# Altium schematic symbol library FPGA_Xilinx_Virtex7.SchLib: 34 symbols (part 5 of 26)
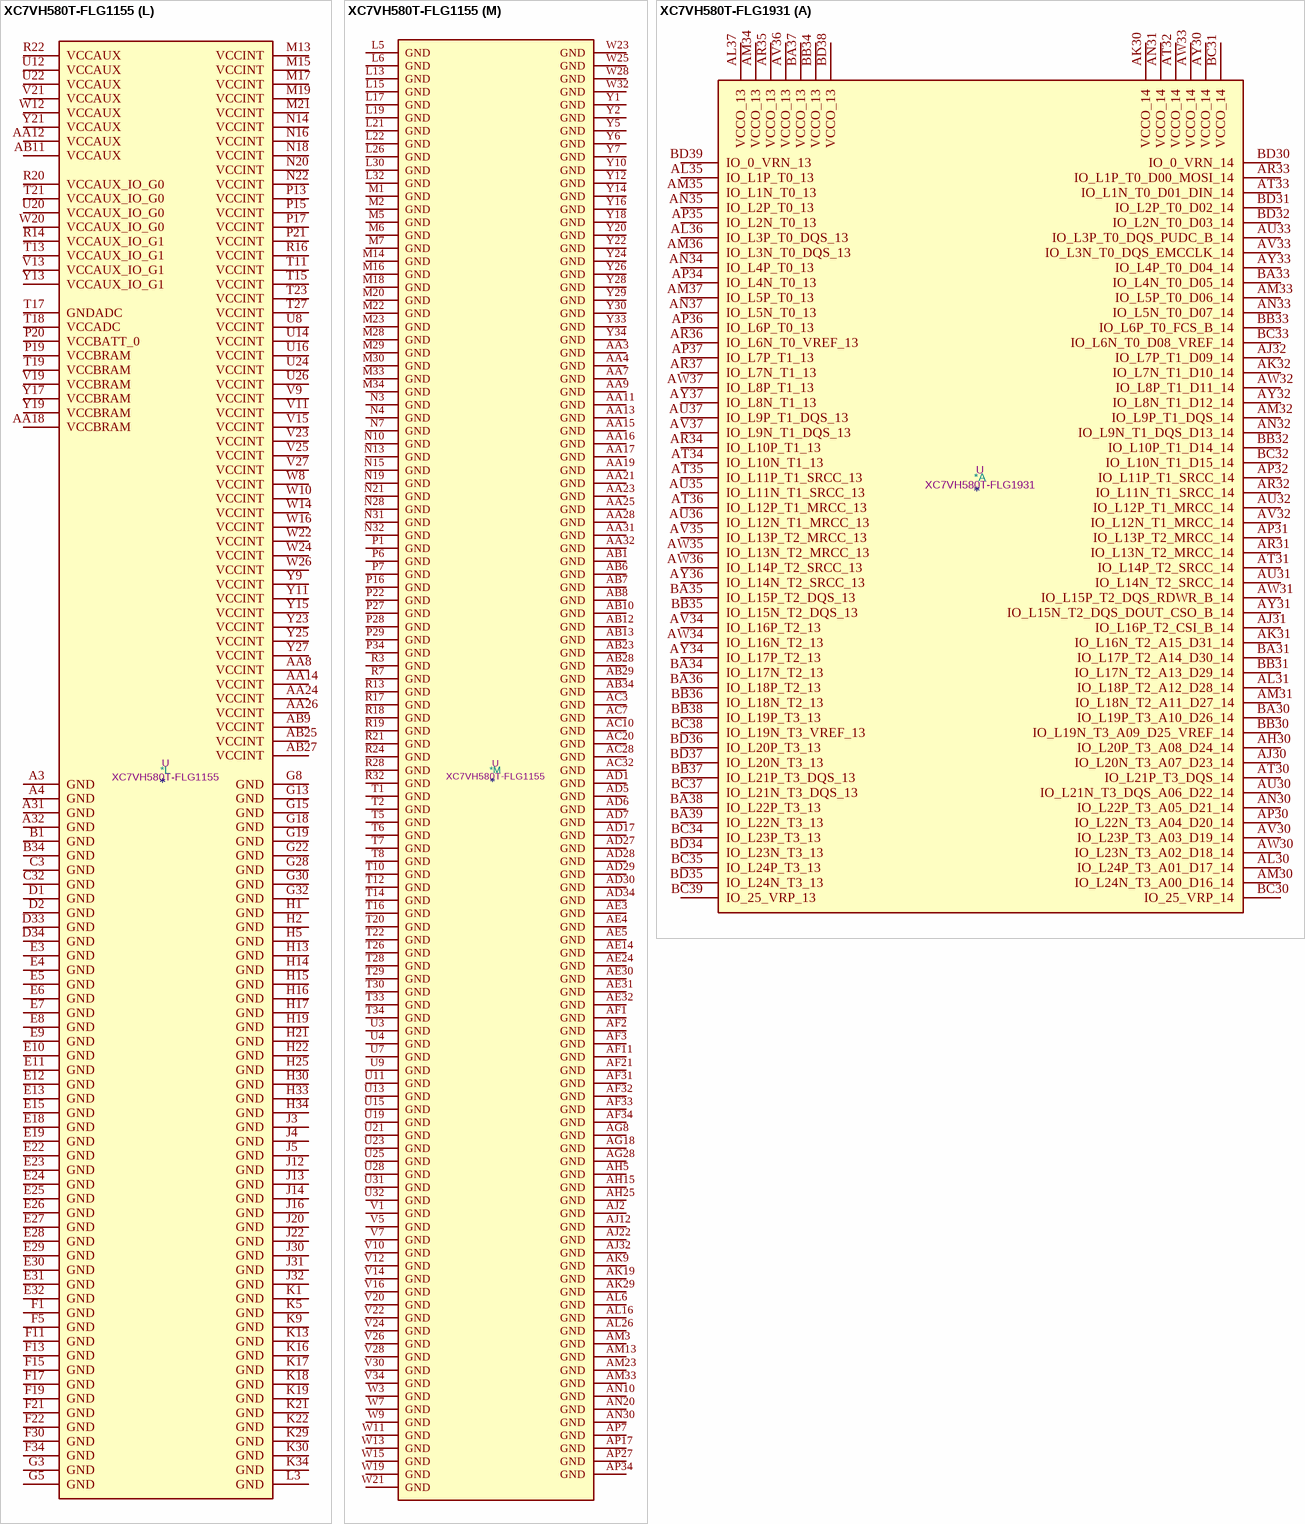
[diagram p176: symbols XC7VH580T-FLG1155 to XC7VH580T-FLG1931]

## XC7VH580T-FLG1155
designator *  value XC7VH580T-FLG1155  Reference: U
ki_keywords: FPGA; ki_description: Virtex 7 HT 580 XC7VH580T-FLG1155
part A pins: AB24 IO_L5P_T0_13, AC23 IO_L1P_T0_13, AC24 IO_L5N_T0_13, AC25 VCCO_13, AC26 IO_L4P_T0_13, AC27 IO_L4N_T0_13, AD23 IO_L1N_T0_13, AD24 IO_L2P_T0_13, AD25 IO_L2N_T0_13, AD26 IO_L3P_T0_DQS_13, AE23 IO_L16P_T2_13, AE25 IO_L17P_T2_13, AE26 IO_L3N_T0_DQS_13, AE27 IO_L6P_T0_13, AE28 IO_L1P_T0_D00_MOSI_14, AE29 VCCO_14, AF23 IO_L16N_T2_13, AF24 IO_L15P_T2_DQS_13, AF25 IO_L17N_T2_13, AF26 VCCO_13, AF27 IO_L6N_T0_VREF_13, AF28 IO_L1N_T0_D01_DIN_14, AF29 IO_L3P_T0_DQS_PUDC_B_14, AF30 IO_L7P_T1_D09_14, AG23 VCCO_13, AG24 IO_L15N_T2_DQS_13, AG25 IO_L14P_T2_SRCC_13, AG26 IO_L14N_T2_SRCC_13, AG27 IO_L7P_T1_13, AG29 IO_L3N_T0_DQS_EMCCLK_14, AG30 IO_L7N_T1_D10_14, AG31 IO_L8P_T1_D11_14, AG32 IO_L8N_T1_D12_14, AG33 VCCO_14, AG34 IO_L10P_T1_D14_14, AH23 IO_L18P_T2_13, AH24 IO_L13P_T2_MRCC_13, AH26 IO_L9P_T1_DQS_13, AH27 IO_L7N_T1_13, AH28 IO_L4P_T0_D04_14, AH29 IO_L4N_T0_D05_14, AH30 VCCO_14, AH31 IO_L11P_T1_SRCC_14, AH32 IO_L9P_T1_DQS_14, AH33 IO_L9N_T1_DQS_D13_14, AH34 IO_L10N_T1_D15_14, AJ23 IO_L18N_T2_13, AJ24 IO_L13N_T2_MRCC_13, AJ25 IO_L11P_T1_SRCC_13, AJ26 IO_L9N_T1_DQS_13, AJ27 VCCO_13, AJ28 IO_L5P_T0_D06_14, AJ29 IO_L2P_T0_D02_14, AJ30 IO_L2N_T0_D03_14, AJ31 IO_L11N_T1_SRCC_14, AJ33 IO_L17P_T2_A14_D30_14, AJ34 IO_L17N_T2_A13_D29_14, AK23 IO_L20P_T3_13, AK24 VCCO_13, AK25 IO_L11N_T1_SRCC_13, AK26 IO_L8P_T1_13, AK27 IO_L8N_T1_13, AK28 IO_L5N_T0_D07_14, AK30 IO_L12P_T1_MRCC_14, AK31 IO_L12N_T1_MRCC_14, AK32 IO_L13P_T2_MRCC_14, AK33 IO_L14P_T2_SRCC_14, AK34 VCCO_14, AL22 IO_L24P_T3_13, AL23 IO_L20N_T3_13, AL24 IO_L12P_T1_MRCC_13, AL25 IO_L12N_T1_MRCC_13, AL27 IO_0_VRN_13, AL28 IO_L6P_T0_FCS_B_14, AL29 IO_L6N_T0_D08_VREF_14, AL30 IO_L21P_T3_DQS_14, AL31 VCCO_14, AL32 IO_L13N_T2_MRCC_14, AL33 IO_L14N_T2_SRCC_14, AL34 IO_L16P_T2_CSI_B_14, AM22 IO_L24N_T3_13, AM24 IO_L23P_T3_13, AM25 IO_L10P_T1_13, AM26 IO_L10N_T1_13, AM27 IO_L20P_T3_A08_D24_14, AM28 VCCO_14, AM29 IO_L19P_T3_A10_D26_14, AM30 IO_L21N_T3_DQS_A06_D22_14, AM31 IO_L23P_T3_A03_D19_14, AM32 IO_L15P_T2_DQS_RDWR_B_14, AM34 IO_L16N_T2_A15_D31_14, AN22 IO_25_VRP_13, AN23 IO_L21P_T3_DQS_13, AN24 IO_L23N_T3_13, AN25 VCCO_13, AN26 IO_L22P_T3_13, AN27 IO_L20N_T3_A07_D23_14, AN28 IO_L24P_T3_A01_D17_14, AN29 IO_L19N_T3_A09_D25_VREF_14, AN31 IO_L23N_T3_A02_D18_14, AN32 IO_L15N_T2_DQS_DOUT_CSO_B_14, AN33 IO_L18P_T2_A12_D28_14, AN34 IO_0_VRN_14, AP22 VCCO_13, AP23 IO_L21N_T3_DQS_13, AP24 IO_L19P_T3_13, AP25 IO_L19N_T3_VREF_13, AP26 IO_L22N_T3_13, AP28 IO_L24N_T3_A00_D16_14, AP29 IO_L22P_T3_A05_D21_14, AP30 IO_L22N_T3_A04_D20_14, AP31 IO_25_VRP_14, AP32 VCCO_14, AP33 IO_L18N_T2_A11_D27_14
part B pins: AA20 IO_L5P_T0_AD9P_15, AA22 VCCO_15, AB18 VCCO_15, AB19 IO_0_VRN_15, AB20 IO_L5N_T0_AD9N_15, AB21 IO_L20P_T3_A20_15, AB22 IO_L22P_T3_A17_15, AC18 IO_L1P_T0_AD0P_15, AC19 IO_L3P_T0_DQS_AD1P_15, AC21 IO_L20N_T3_A19_15, AC22 IO_L22N_T3_A16_15, AD18 IO_L1N_T0_AD0N_15, AD19 IO_L3N_T0_DQS_AD1N_15, AD20 IO_L16P_T2_A28_15, AD21 IO_L21P_T3_DQS_15, AD22 VCCO_15, AE18 IO_L4P_T0_15, AE19 VCCO_15, AE20 IO_L16N_T2_A27_15, AE21 IO_L21N_T3_DQS_A18_15, AE22 IO_L24P_T3_RS1_15, AF18 IO_L4N_T0_15, AF19 IO_L6P_T0_15, AF20 IO_L18P_T2_A24_15, AF22 IO_L24N_T3_RS0_15, AG19 IO_L6N_T0_VREF_15, AG20 IO_L18N_T2_A23_15, AG21 IO_25_VRP_15, AG22 IO_L23P_T3_FOE_B_15, AH18 IO_L2P_T0_AD8P_15, AH19 IO_L2N_T0_AD8N_15, AH20 VCCO_15, AH21 IO_L17P_T2_A26_15, AH22 IO_L23N_T3_FWE_B_15, AJ18 IO_L15P_T2_DQS_15, AJ19 IO_L15N_T2_DQS_ADV_B_15, AJ20 IO_L13P_T2_MRCC_15, AJ21 IO_L17N_T2_A25_15, AK18 IO_L7P_T1_AD2P_15, AK20 IO_L13N_T2_MRCC_15, AK21 IO_L19P_T3_A22_15, AK22 IO_L19N_T3_A21_VREF_15, AL18 IO_L7N_T1_AD2N_15, AL19 IO_L14P_T2_SRCC_15, AL20 IO_L14N_T2_SRCC_15, AL21 VCCO_15, AM18 VCCO_15, AM19 IO_L12P_T1_MRCC_15, AM20 IO_L12N_T1_MRCC_15, AM21 IO_L11P_T1_SRCC_15, AN18 IO_L10P_T1_AD11P_15, AN19 IO_L9P_T1_DQS_AD3P_15, AN21 IO_L11N_T1_SRCC_15, AP18 IO_L10N_T1_AD11N_15, AP19 IO_L9N_T1_DQS_AD3N_15, AP20 IO_L8P_T1_AD10P_15, AP21 IO_L8N_T1_AD10N_15, F23 IO_25_VRP_16, F24 IO_L8P_T1_16, F25 IO_L8N_T1_16, F26 VCCO_16, F27 IO_L19P_T3_16, F28 IO_L19N_T3_VREF_16, F29 VCCO_16, G23 VCCO_16, G24 IO_L9N_T1_DQS_16, G25 IO_L10P_T1_16, G26 IO_L10N_T1_16, G27 IO_L22N_T3_16, G29 IO_L23N_T3_16, H23 IO_L7P_T1_16, H24 IO_L9P_T1_DQS_16, H26 IO_L12N_T1_MRCC_16, H27 IO_L22P_T3_16, H28 IO_L21N_T3_DQS_16, H29 IO_L23P_T3_16, J23 IO_L6N_T0_VREF_16, J24 IO_L7N_T1_16, J25 IO_L11N_T1_SRCC_16, J26 IO_L12P_T1_MRCC_16, J27 VCCO_16, J28 IO_L21P_T3_DQS_16, J29 IO_L20N_T3_16, K23 IO_L6P_T0_16, K24 VCCO_16, K25 IO_L11P_T1_SRCC_16, K26 IO_L13P_T2_MRCC_16, K27 IO_L13N_T2_MRCC_16, K28 IO_L20P_T3_16, L23 IO_L2P_T0_16, L24 IO_L2N_T0_16, L25 IO_L14N_T2_SRCC_16, L27 IO_L17N_T2_16, L28 IO_L24P_T3_16, L29 IO_L24N_T3_16, M24 IO_0_VRN_16, M25 IO_L14P_T2_SRCC_16, M26 IO_L17P_T2_16, M27 IO_L18N_T2_16, N23 IO_L4N_T0_16, N24 IO_L3N_T0_DQS_16, N25 VCCO_16, N26 IO_L15N_T2_DQS_16, N27 IO_L18P_T2_16, P23 IO_L4P_T0_16, P24 IO_L3P_T0_DQS_16, P25 IO_L5N_T0_16, P26 IO_L15P_T2_DQS_16, R23 IO_L1P_T0_16, R25 IO_L5P_T0_16, R26 IO_L16P_T2_16, R27 IO_L16N_T2_16, T24 IO_L1N_T0_16, T25 VCCO_16
part C pins: AC8 IO_L4P_T0_33, AC9 IO_L2P_T0_33, AC11 IO_L1N_T0_33, AC12 IO_L1P_T0_33, AD8 IO_L4N_T0_33, AD9 IO_L2N_T0_33, AD10 IO_L3N_T0_DQS_33, AD11 IO_L3P_T0_DQS_33, AD12 VCCO_33, AE6 IO_L1P_T0_34, AE7 IO_L5P_T0_34, AE8 IO_L6P_T0_33, AE9 VCCO_33, AE10 IO_L5N_T0_33, AE11 IO_L5P_T0_33, AE12 IO_L16P_T2_33, AF4 IO_L7P_T1_34, AF5 IO_L1N_T0_34, AF6 VCCO_34, AF7 IO_L5N_T0_34, AF8 IO_L6N_T0_VREF_33, AF9 IO_L17P_T2_33, AF10 IO_L15P_T2_DQS_33, AF12 IO_L16N_T2_33, AG1 IO_L10P_T1_34, AG2 IO_L9P_T1_DQS_34, AG3 VCCO_34, AG4 IO_L7N_T1_34, AG5 IO_L2N_T0_34, AG6 IO_L2P_T0_34, AG7 IO_L4P_T0_34, AG9 IO_L17N_T2_33, AG10 IO_L15N_T2_DQS_33, AG11 IO_L13P_T2_MRCC_33, AG12 IO_L18P_T2_33, AH1 IO_L10N_T1_34, AH2 IO_L9N_T1_DQS_34, AH3 IO_L8N_T1_34, AH4 IO_L8P_T1_34, AH6 IO_L3P_T0_DQS_34, AH7 IO_L4N_T0_34, AH8 IO_L7N_T1_33, AH9 IO_L7P_T1_33, AH10 VCCO_33, AH11 IO_L13N_T2_MRCC_33, AH12 IO_L18N_T2_33, AJ1 IO_L17P_T2_34, AJ3 IO_L11N_T1_SRCC_34, AJ4 IO_L11P_T1_SRCC_34, AJ5 IO_L12P_T1_MRCC_34, AJ6 IO_L3N_T0_DQS_34, AJ7 VCCO_34, AJ8 IO_L9N_T1_DQS_33, AJ9 IO_L9P_T1_DQS_33, AJ10 IO_L14N_T2_SRCC_33, AJ11 IO_L14P_T2_SRCC_33, AK1 IO_L17N_T2_34, AK2 IO_L14P_T2_SRCC_34, AK3 IO_L13P_T2_MRCC_34, AK4 VCCO_34, AK5 IO_L12N_T1_MRCC_34, AK6 IO_L6N_T0_VREF_34, AK7 IO_L6P_T0_34, AK8 IO_L8P_T1_33, AK10 IO_L11N_T1_SRCC_33, AK11 IO_L11P_T1_SRCC_33, AK12 IO_L20P_T3_33, AL1 VCCO_34, AL2 IO_L14N_T2_SRCC_34, AL3 IO_L13N_T2_MRCC_34, AL4 IO_L23N_T3_34, AL5 IO_L23P_T3_34, AL7 IO_L20P_T3_34, AL8 IO_L8N_T1_33, AL9 IO_L12N_T1_MRCC_33, AL10 IO_L12P_T1_MRCC_33, AL11 VCCO_33, AL12 IO_L20N_T3_33, AM1 IO_L16P_T2_34, AM2 IO_L15P_T2_DQS_34, AM4 IO_L21P_T3_DQS_34, AM5 IO_L19N_T3_VREF_34, AM6 IO_L19P_T3_34, AM7 IO_L20N_T3_34, AM8 VCCO_33, AM9 IO_L10N_T1_33, AM10 IO_L10P_T1_33, AM11 IO_L24N_T3_33, AM12 IO_L24P_T3_33, AN1 IO_L16N_T2_34, AN2 IO_L15N_T2_DQS_34, AN3 IO_L18P_T2_34, AN4 IO_L21N_T3_DQS_34, AN5 VCCO_34, AN6 IO_L24N_T3_34, AN7 IO_L24P_T3_34, AN8 IO_L22N_T3_33, AN9 IO_L22P_T3_33, AN11 IO_L21N_T3_DQS_33, AN12 IO_L21P_T3_DQS_33, AN13 IO_L23P_T3_33, AP1 IO_0_VRN_34, AP2 VCCO_34, AP3 IO_L18N_T2_34, AP4 IO_25_VRP_34, AP5 IO_L22N_T3_34, AP6 IO_L22P_T3_34, AP8 IO_0_VRN_33, AP9 IO_L19N_T3_VREF_33, AP10 IO_L19P_T3_33, AP11 IO_25_VRP_33, AP12 VCCO_33, AP13 IO_L23N_T3_33
part D pins: AB14 IO_L20P_T3_35, AB15 IO_0_VRN_35, AB16 IO_L4P_T0_35, AB17 IO_L1P_T0_AD4P_35, AC13 IO_L22P_T3_35, AC14 IO_L20N_T3_35, AC15 VCCO_35, AC16 IO_L4N_T0_35, AC17 IO_L1N_T0_AD4N_35, AD13 IO_L22N_T3_35, AD14 IO_25_VRP_35, AD15 IO_L16P_T2_35, AD16 IO_L3P_T0_DQS_AD5P_35, AE13 IO_L24P_T3_35, AE15 IO_L16N_T2_35, AE16 IO_L3N_T0_DQS_AD5N_35, AE17 IO_L5P_T0_AD13P_35, AF13 IO_L24N_T3_35, AF14 IO_L21P_T3_DQS_35, AF15 IO_L18P_T2_35, AF16 VCCO_35, AF17 IO_L5N_T0_AD13N_35, AG13 VCCO_35, AG14 IO_L21N_T3_DQS_35, AG15 IO_L18N_T2_35, AG16 IO_L6P_T0_35, AG17 IO_L2P_T0_AD12P_35, AH13 IO_L23P_T3_35, AH14 IO_L19P_T3_35, AH16 IO_L6N_T0_VREF_35, AH17 IO_L2N_T0_AD12N_35, AJ13 IO_L23N_T3_35, AJ14 IO_L19N_T3_VREF_35, AJ15 IO_L13P_T2_MRCC_35, AJ16 IO_L15P_T2_DQS_35, AJ17 VCCO_35, AK13 IO_L17P_T2_35, AK14 VCCO_35, AK15 IO_L13N_T2_MRCC_35, AK16 IO_L15N_T2_DQS_35, AK17 IO_L7P_T1_AD6P_35, AL13 IO_L17N_T2_35, AL14 IO_L14N_T2_SRCC_35, AL15 IO_L14P_T2_SRCC_35, AL17 IO_L7N_T1_AD6N_35, AM14 IO_L11P_T1_SRCC_35, AM15 IO_L12N_T1_MRCC_35, AM16 IO_L12P_T1_MRCC_35, AM17 IO_L9P_T1_DQS_AD7P_35, AN14 IO_L11N_T1_SRCC_35, AN15 VCCO_35, AN16 IO_L8P_T1_AD14P_35, AN17 IO_L9N_T1_DQS_AD7N_35, AP14 IO_L10N_T1_AD15N_35, AP15 IO_L10P_T1_AD15P_35, AP16 IO_L8N_T1_AD14N_35, F6 VCCO_36, F7 IO_L22N_T3_36, F8 IO_L22P_T3_36, F9 IO_L10N_T1_36, F10 IO_25_VRP_36, F12 IO_L8N_T1_36, G6 IO_L23N_T3_36, G7 IO_L21N_T3_DQS_36, G9 IO_L10P_T1_36, G10 IO_L9N_T1_DQS_36, G11 IO_L9P_T1_DQS_36, G12 IO_L8P_T1_36, H6 IO_L23P_T3_36, H7 IO_L21P_T3_DQS_36, H8 IO_L19N_T3_VREF_36, H9 IO_L12N_T1_MRCC_36, H10 VCCO_36, H11 IO_L7N_T1_36, H12 IO_L7P_T1_36, J6 IO_L20N_T3_36, J7 VCCO_36, J8 IO_L19P_T3_36, J9 IO_L12P_T1_MRCC_36, J10 IO_L11N_T1_SRCC_36, J11 IO_L6N_T0_VREF_36, K6 IO_L20P_T3_36, K7 IO_L24N_T3_36, K8 IO_L17N_T2_36, K10 IO_L11P_T1_SRCC_36, K11 IO_L6P_T0_36, K12 IO_L2N_T0_36, L7 IO_L24P_T3_36, L8 IO_L17P_T2_36, L9 IO_L13N_T2_MRCC_36, L10 IO_L14N_T2_SRCC_36, L11 VCCO_36, L12 IO_L2P_T0_36, M8 VCCO_36, M9 IO_L13P_T2_MRCC_36, M10 IO_L14P_T2_SRCC_36, M11 IO_L4N_T0_36, M12 IO_L4P_T0_36, N8 IO_L18N_T2_36, N9 IO_L15N_T2_DQS_36, N11 IO_L3N_T0_DQS_36, N12 IO_0_VRN_36, P8 IO_L18P_T2_36, P9 IO_L15P_T2_DQS_36, P10 IO_L5N_T0_36, P11 IO_L3P_T0_DQS_36, P12 VCCO_36, R8 IO_L16N_T2_36, R9 VCCO_36, R10 IO_L5P_T0_36, R11 IO_L1N_T0_36, R12 IO_L1P_T0_36, T9 IO_L16P_T2_36
part E pins: AA1 MGTHTXN1_113, AA2 MGTHTXP1_113, AA5 MGTREFCLK1N_113, AA6 MGTREFCLK1P_113, AB3 MGTHRXN2_113, AB4 MGTHRXP2_113, AC1 MGTHTXN0_113, AC2 MGTHTXP0_113, AC5 MGTREFCLK0N_113, AC6 MGTREFCLK0P_113, AD3 MGTHRXN1_113, AD4 MGTHRXP1_113, J1 MGTHTXN3_114, J2 MGTHTXP3_114, K3 MGTHRXN2_114, K4 MGTHRXP2_114, L1 MGTHTXN2_114, L2 MGTHTXP2_114, M3 MGTHRXN3_114, M4 MGTHRXP3_114, N1 MGTHTXN1_114, N2 MGTHTXP1_114, P3 MGTHRXN1_114, P4 MGTHRXP1_114, R1 MGTHTXN0_114, R2 MGTHTXP0_114, T3 MGTHRXN0_114, T4 MGTHRXP0_114, U1 MGTHTXN3_113, U2 MGTHTXP3_113, U5 MGTREFCLK1N_114, U6 MGTREFCLK1P_114, V3 MGTHRXN3_113, V4 MGTHRXP3_113, W1 MGTHTXN2_113, W2 MGTHTXP2_113, W5 MGTREFCLK0N_114, W6 MGTREFCLK0P_114, Y3 MGTHRXN0_113, Y4 MGTHRXP0_113
part F pins: A1 MGTHTXN3_115, A2 MGTHTXP3_115, AA29 MGTREFCLK1P_213, AA30 MGTREFCLK1N_213, AA33 MGTHTXP1_213, AA34 MGTHTXN1_213, AB31 MGTHRXP2_213, AB32 MGTHRXN2_213, AC29 MGTREFCLK0P_213, AC30 MGTREFCLK0N_213, AC33 MGTHTXP0_213, AC34 MGTHTXN0_213, AD31 MGTHRXP1_213, AD32 MGTHRXN1_213, B3 MGTHRXN3_115, B4 MGTHRXP3_115, C1 MGTHTXN2_115, C2 MGTHTXP2_115, D3 MGTHRXN2_115, D4 MGTHRXP2_115, E1 MGTHTXN1_115, E2 MGTHTXP1_115, F3 MGTHRXN1_115, F4 MGTHRXP1_115, G1 MGTHTXN0_115, G2 MGTHTXP0_115, H3 MGTHRXN0_115, H4 MGTHRXP0_115, N5 MGTREFCLK0N_115, N6 MGTREFCLK0P_115, R5 MGTREFCLK1N_115, R6 MGTREFCLK1P_115, U33 MGTHTXP3_213, U34 MGTHTXN3_213, V31 MGTHRXP3_213, V32 MGTHRXN3_213, W33 MGTHTXP2_213, W34 MGTHTXN2_213, Y31 MGTHRXP0_213, Y32 MGTHRXN0_213
part G pins: A33 MGTHTXP3_215, A34 MGTHTXN3_215, B31 MGTHRXP3_215, B32 MGTHRXN3_215, C33 MGTHTXP2_215, C34 MGTHTXN2_215, D31 MGTHRXP2_215, D32 MGTHRXN2_215, E33 MGTHTXP1_215, E34 MGTHTXN1_215, F31 MGTHRXP1_215, F32 MGTHRXN1_215, G33 MGTHTXP0_215, G34 MGTHTXN0_215, H31 MGTHRXP0_215, H32 MGTHRXN0_215, J33 MGTHTXP3_214, J34 MGTHTXN3_214, K31 MGTHRXP2_214, K32 MGTHRXN2_214, L33 MGTHTXP2_214, L34 MGTHTXN2_214, M31 MGTHRXP3_214, M32 MGTHRXN3_214, N29 MGTREFCLK0P_215, N30 MGTREFCLK0N_215, N33 MGTHTXP1_214, N34 MGTHTXN1_214, P31 MGTHRXP1_214, P32 MGTHRXN1_214, R29 MGTREFCLK1P_215, R30 MGTREFCLK1N_215, R33 MGTHTXP0_214, R34 MGTHTXN0_214, T31 MGTHRXP0_214, T32 MGTHRXN0_214, U29 MGTREFCLK1P_214, U30 MGTREFCLK1N_214, W29 MGTREFCLK0P_214, W30 MGTREFCLK0N_214
part H pins: AB2 MGTAVTT_G10, AB5 MGTAVCC_G10, AB30 MGTAVCC_G20, AB33 MGTAVTT_G20, AC4 MGTAVCC_G10, AC31 MGTAVCC_G20, AD2 MGTAVTT_G10, AD33 MGTAVTT_G20, AE1 MGTRREF_115, AE2 MGTAVTTRCAL_115, AE33 MGTAVTTRCAL_215, AE34 MGTRREF_215, B2 MGTAVTT_G10, B33 MGTAVTT_G20, C4 MGTAVCC_G10, C31 MGTAVCC_G20, F2 MGTAVTT_G10, F33 MGTAVTT_G20, G4 MGTAVCC_G10, G31 MGTAVCC_G20, K2 MGTAVTT_G10, K33 MGTAVTT_G20, L4 MGTAVCC_G10, L31 MGTAVCC_G20, P2 MGTAVTT_G10, P5 MGTAVCC_G10, P30 MGTAVCC_G20, P33 MGTAVTT_G20, R4 MGTAVCC_G10, R31 MGTAVCC_G20, V2 MGTAVTT_G10, V6 MGTVCCAUX_G10, V29 MGTVCCAUX_G20, V33 MGTAVTT_G20, W4 MGTAVCC_G10, W31 MGTAVCC_G20
part I pins: A6 MGTZRXN7_300, A7 MGTZRXP7_300, A9 MGTZRXN5_300, A10 MGTZRXP5_300, A12 MGTZTXN7_300, A13 MGTZTXP7_300, A15 MGTZTXN5_300, A16 MGTZTXP5_300, A18 MGTZRXN3_300, A19 MGTZRXP3_300, A21 MGTZRXN1_300, A22 MGTZRXP1_300, A24 MGTZTXN3_300, A25 MGTZTXP3_300, A27 MGTZTXN1_300, A28 MGTZTXP1_300, C7 MGTZRXN6_300, C8 MGTZRXP6_300, C10 MGTZRXN4_300, C11 MGTZRXP4_300, C13 MGTZTXN6_300, C14 MGTZTXP6_300, C16 MGTZTXN4_300, C17 MGTZTXP4_300, C19 MGTZRXN2_300, C20 MGTZRXP2_300, C22 MGTZRXN0_300, C23 MGTZRXP0_300, C25 MGTZTXN2_300, C26 MGTZTXP2_300, C28 MGTZTXN0_300, C29 MGTZTXP0_300, E16 MGTZREFCLK0N_300, E17 MGTZREFCLK0P_300, E20 MGTZREFCLK1N_300, E21 MGTZREFCLK1P_300, G16 MGTZ_THERM_OUT_300, G17 MGTZ_THERM_IN_300, H18 MGTZ_OBS_CLK_N_300, J18 MGTZ_OBS_CLK_P_300
part J pins: A5 MGTZAGND_300, A8 MGTZAGND_300, A11 MGTZAGND_300, A14 MGTZAGND_300, A17 MGTZAGND_300, A20 MGTZAGND_300, A23 MGTZAGND_300, A26 MGTZAGND_300, A29 MGTZAGND_300, A30 MGTZAGND_300, B5 MGTZAGND_300, B6 MGTZAVCC_300, B7 MGTZAGND_300, B8 MGTZAVCC_300, B9 MGTZAGND_300, B10 MGTZAVCC_300, B11 MGTZAGND_300, B12 MGTZAVCC_300, B13 MGTZAGND_300, B14 MGTZAVCC_300, B15 MGTZAGND_300, B16 MGTZAVCC_300, B17 MGTZAGND_300, B18 MGTZAVCC_300, B19 MGTZAGND_300, B20 MGTZAVCC_300, B21 MGTZAGND_300, B22 MGTZAVCC_300, B23 MGTZAGND_300, B24 MGTZAVCC_300, B25 MGTZAGND_300, B26 MGTZAVCC_300, B27 MGTZAGND_300, B28 MGTZAVCC_300, B29 MGTZAGND_300, B30 MGTZAGND_300, C5 MGTZAGND_300, C6 MGTZAGND_300, C9 MGTZAGND_300, C12 MGTZAGND_300, C15 MGTZAGND_300, C18 MGTZAGND_300, C21 MGTZAGND_300, C24 MGTZAGND_300, C27 MGTZAGND_300, C30 MGTZAGND_300, D5 MGTZAGND_300, D6 MGTZAGND_300, D7 MGTZAGND_300, D8 MGTZAGND_300, D9 MGTZAGND_300, D10 MGTZAGND_300, D11 MGTZAGND_300, D12 MGTZAGND_300, D13 MGTZAGND_300, D14 MGTZAGND_300, D15 MGTZAGND_300, D16 MGTZAGND_300, D17 MGTZAGND_300, D18 MGTZAGND_300, D19 MGTZAGND_300, D20 MGTZAGND_300, D21 MGTZAGND_300, D22 MGTZAGND_300, D23 MGTZAGND_300, D24 MGTZAGND_300, D25 MGTZAGND_300, D26 MGTZAGND_300, D27 MGTZAGND_300, D28 MGTZAGND_300, D29 MGTZAGND_300, D30 MGTZAGND_300, E14 MGTZ_SENSE_AVCC_300, F14 MGTZ_SENSE_AGND_300, F16 MGTZVCCH_300, F18 MGTZVCCH_300, F20 MGTZVCCH_300, G14 MGTZVCCH_300, G20 MGTZ_SENSE_GND_300, G21 MGTZ_SENSE_VCCH_300, H20 MGTZ_SENSE_VCC_300, J15 MGTZVCCH_300, J17 MGTZVCCH_300, J19 MGTZVCCH_300, J21 MGTZVCCH_300, K14 MGTZ_SENSE_GNDL_300, K15 MGTZ_SENSE_VCCL_300, L14 MGTZVCCL_300, L16 MGTZVCCL_300, L18 MGTZVCCL_300, L20 MGTZVCCL_300
part K pins: AA10 VCCO_0, AA27 M2_0, AB26 M0_0, K20 TDO_0, N17 TCK_0, P14 TDI_0, P18 CCLK_0, R15 TMS_0, U10 VCCO_0, U17 VREFN_0, U18 VP_0, U27 DONE_0, V8 INIT_B_0, V17 VN_0, V18 VREFP_0, W17 DXN_0, W18 DXP_0, W27 PROGRAM_B_0, Y8 M1_0
part L pins: A3 GND, A4 GND, A31 GND, A32 GND, AA8 VCCINT, AA12 VCCAUX, AA14 VCCINT, AA18 VCCBRAM, AA24 VCCINT, AA26 VCCINT, AB9 VCCINT, AB11 VCCAUX, AB25 VCCINT, AB27 VCCINT, B1 GND, B34 GND, C3 GND, C32 GND, D1 GND, D2 GND, D33 GND, D34 GND, E3 GND, E4 GND, E5 GND, E6 GND, E7 GND, E8 GND, E9 GND, E10 GND, E11 GND, E12 GND, E13 GND, E15 GND, E18 GND, E19 GND, E22 GND, E23 GND, E24 GND, E25 GND, E26 GND, E27 GND, E28 GND, E29 GND, E30 GND, E31 GND, E32 GND, F1 GND, F5 GND, F11 GND, F13 GND, F15 GND, F17 GND, F19 GND, F21 GND, F22 GND, F30 GND, F34 GND, G3 GND, G5 GND, G8 GND, G13 GND, G15 GND, G18 GND, G19 GND, G22 GND, G28 GND, G30 GND, G32 GND, H1 GND, H2 GND, H5 GND, H13 GND, H14 GND, H15 GND, H16 GND, H17 GND, H19 GND, H21 GND, H22 GND, H25 GND, H30 GND, H33 GND, H34 GND, J3 GND, J4 GND, J5 GND, J12 GND, J13 GND, J14 GND, J16 GND, J20 GND, J22 GND, J30 GND, J31 GND, J32 GND, K1 GND, K5 GND, K9 GND, K13 GND, K16 GND, K17 GND, K18 GND, K19 GND, K21 GND, K22 GND, K29 GND, K30 GND, K34 GND, L3 GND, M13 VCCINT, M15 VCCINT, M17 VCCINT, M19 VCCINT, M21 VCCINT, N14 VCCINT, N16 VCCINT, N18 VCCINT, N20 VCCINT, N22 VCCINT, P13 VCCINT, P15 VCCINT, P17 VCCINT, P19 VCCBRAM, P20 VCCBATT_0, P21 VCCINT, R14 VCCAUX_IO_G1, R16 VCCINT, R20 VCCAUX_IO_G0, R22 VCCAUX, T11 VCCINT, T13 VCCAUX_IO_G1, T15 VCCINT, T17 GNDADC, T18 VCCADC, T19 VCCBRAM, T21 VCCAUX_IO_G0, T23 VCCINT, T27 VCCINT, U8 VCCINT, U12 VCCAUX, U14 VCCINT, U16 VCCINT, U20 VCCAUX_IO_G0, U22 VCCAUX, U24 VCCINT, U26 VCCINT, V9 VCCINT, V11 VCCINT, V13 VCCAUX_IO_G1, V15 VCCINT, V19 VCCBRAM, V21 VCCAUX, V23 VCCINT, V25 VCCINT, V27 VCCINT, W8 VCCINT, W10 VCCINT, W12 VCCAUX, W14 VCCINT, W16 VCCINT, W20 VCCAUX_IO_G0, W22 VCCINT, W24 VCCINT, W26 VCCINT, Y9 VCCINT, Y11 VCCINT, Y13 VCCAUX_IO_G1, Y15 VCCINT, Y17 VCCBRAM, Y19 VCCBRAM, Y21 VCCAUX, Y23 VCCINT, Y25 VCCINT, Y27 VCCINT
part M pins: AA3 GND, AA4 GND, AA7 GND, AA9 GND, AA11 GND, AA13 GND, AA15 GND, AA16 GND, AA17 GND, AA19 GND, AA21 GND, AA23 GND, AA25 GND, AA28 GND, AA31 GND, AA32 GND, AB1 GND, AB6 GND, AB7 GND, AB8 GND, AB10 GND, AB12 GND, AB13 GND, AB23 GND, AB28 GND, AB29 GND, AB34 GND, AC3 GND, AC7 GND, AC10 GND, AC20 GND, AC28 GND, AC32 GND, AD1 GND, AD5 GND, AD6 GND, AD7 GND, AD17 GND, AD27 GND, AD28 GND, AD29 GND, AD30 GND, AD34 GND, AE3 GND, AE4 GND, AE5 GND, AE14 GND, AE24 GND, AE30 GND, AE31 GND, AE32 GND, AF1 GND, AF2 GND, AF3 GND, AF11 GND, AF21 GND, AF31 GND, AF32 GND, AF33 GND, AF34 GND, AG8 GND, AG18 GND, AG28 GND, AH5 GND, AH15 GND, AH25 GND, AJ2 GND, AJ12 GND, AJ22 GND, AJ32 GND, AK9 GND, AK19 GND, AK29 GND, AL6 GND, AL16 GND, AL26 GND, AM3 GND, AM13 GND, AM23 GND, AM33 GND, AN10 GND, AN20 GND, AN30 GND, AP7 GND, AP17 GND, AP27 GND, AP34 GND, L5 GND, L6 GND, L13 GND, L15 GND, L17 GND, L19 GND, L21 GND, L22 GND, L26 GND, L30 GND, L32 GND, M1 GND, M2 GND, M5 GND, M6 GND, M7 GND, M14 GND, M16 GND, M18 GND, M20 GND, M22 GND, M23 GND, M28 GND, M29 GND, M30 GND, M33 GND, M34 GND, N3 GND, N4 GND, N7 GND, N10 GND, N13 GND, N15 GND, N19 GND, N21 GND, N28 GND, N31 GND, N32 GND, P1 GND, P6 GND, P7 GND, P16 GND, P22 GND, P27 GND, P28 GND, P29 GND, P34 GND, R3 GND, R7 GND, R13 GND, R17 GND, R18 GND, R19 GND, R21 GND, R24 GND, R28 GND, R32 GND, T1 GND, T2 GND, T5 GND, T6 GND, T7 GND, T8 GND, T10 GND, T12 GND, T14 GND, T16 GND, T20 GND, T22 GND, T26 GND, T28 GND, T29 GND, T30 GND, T33 GND, T34 GND, U3 GND, U4 GND, U7 GND, U9 GND, U11 GND, U13 GND, U15 GND, U19 GND, U21 GND, U23 GND, U25 GND, U28 GND, U31 GND, U32 GND, V1 GND, V5 GND, V7 GND, V10 GND, V12 GND, V14 GND, V16 GND, V20 GND, V22 GND, V24 GND, V26 GND, V28 GND, V30 GND, V34 GND, W3 GND, W7 GND, W9 GND, W11 GND, W13 GND, W15 GND, W19 GND, W21 GND, W23 GND, W25 GND, W28 GND, W32 GND, Y1 GND, Y2 GND, Y5 GND, Y6 GND, Y7 GND, Y10 GND, Y12 GND, Y14 GND, Y16 GND, Y18 GND, Y20 GND, Y22 GND, Y24 GND, Y26 GND, Y28 GND, Y29 GND, Y30 GND, Y33 GND, Y34 GND

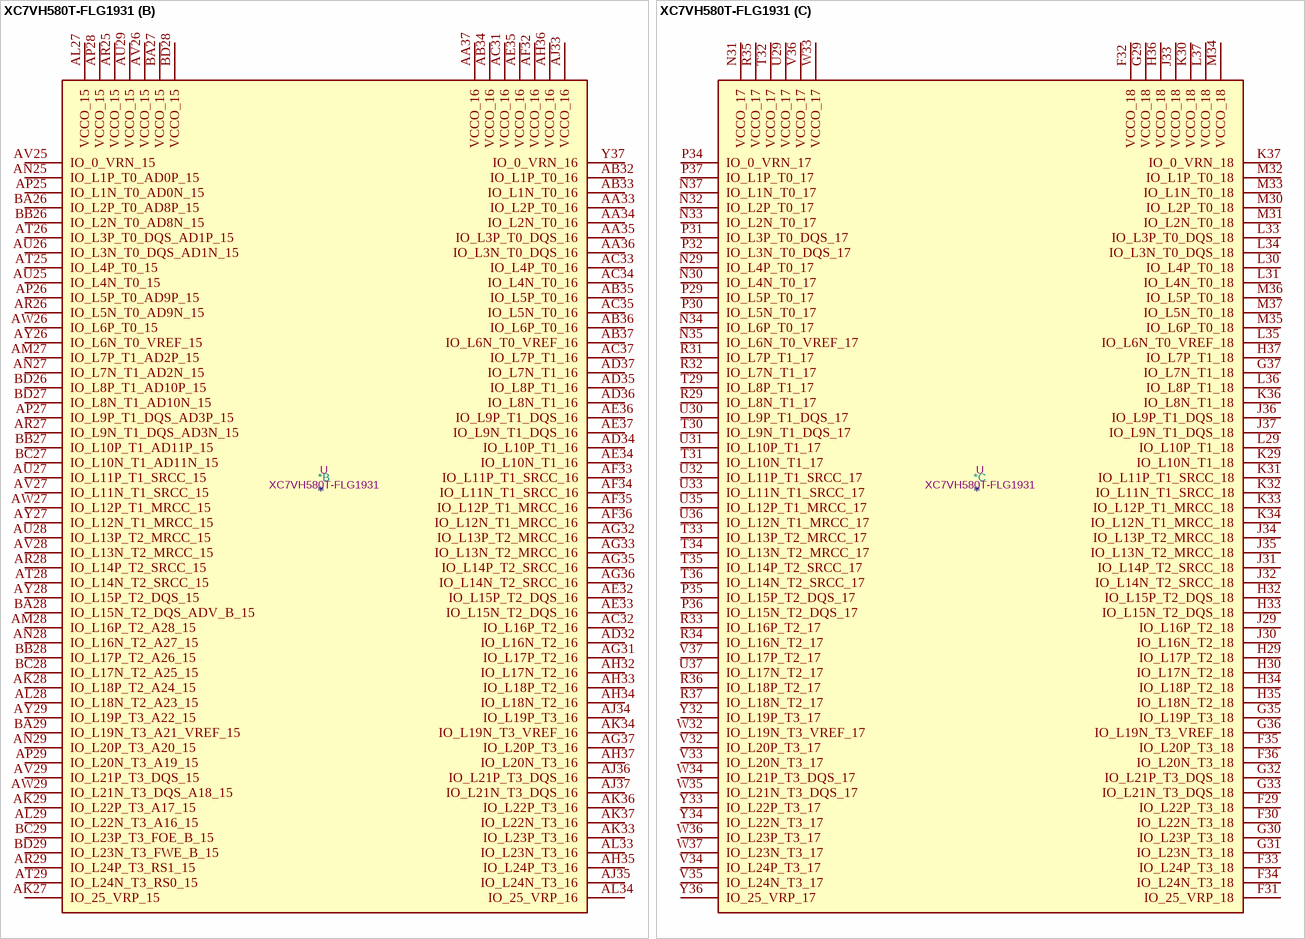
[diagram p27: symbol XC7VH580T-FLG1931]

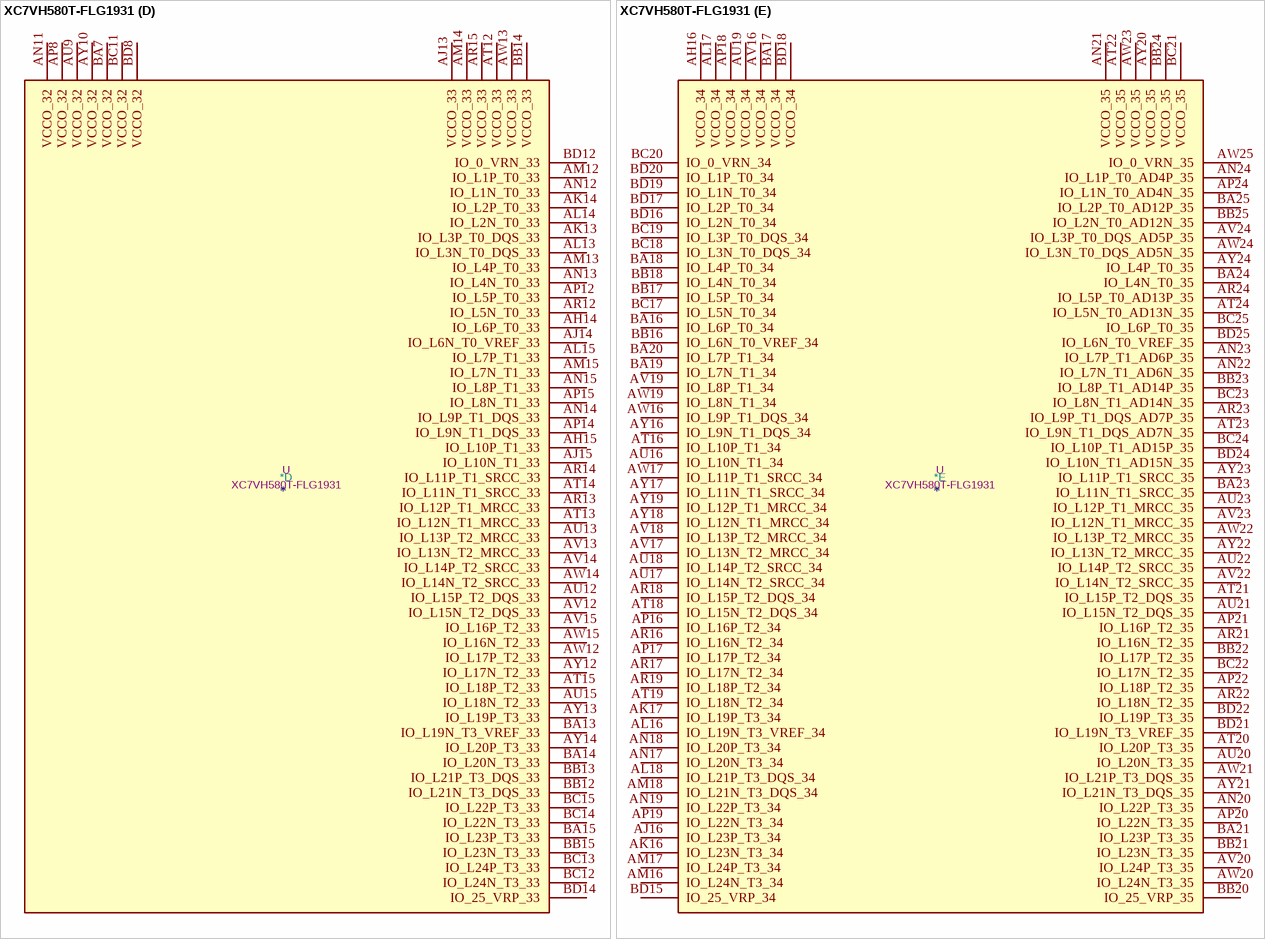
[diagram p28: symbol XC7VH580T-FLG1931]